# Altium schematic symbol library jlcpcb_2025_04_capacitors_extended_0201.schlib: 1175 symbols (part 3 of 7) (continued)
## CQ0201ARNPO8BNR20
designator C?  Capacitance: 0.2pF  (hidden comment: *)
Capacitor, Ceramic (MLCC), 0.2pF, 25V, NP0, SMD 0201; Manufacturer: YAGEO; Manufacturer Part Number: CQ0201ARNPO8BNR20; Package Size: 0201; JLCPCB Basic Part: No; JLCPCB Part Number: C914770; Supplier 1: LCSC; Category: Capacitors - MLCC; Supplier Part Number 1: C914770; Voltage Rating: 25V; Temperature Coefficient: NP0; RoHS: Yes; ComponentLink1Description: Datasheet; ComponentLink1URL: https://wmsc.lcsc.com/wmsc/upload/file/pdf/v2/lcsc/2204291430_YAGEO-CQ0201ARNPO8BNR20_C914770.pdf; ComponentLink2Description: JLCPCB Part URL; ComponentLink2URL: https://jlcpcb.com/partdetail/C914770; ComponentLink3Description: LCSC Part URL; ComponentLink3URL: https://lcsc.com/product-detail/Multilayer-Ceramic-Capacitors-MLCC---SMD-SMT_YAGEO-YAGEO-CQ0201ARNPO8BNR20_C914770.html
footprint CAP-0201 (0201 (0603M) Capacitor)
pins: 1, 2

## CQ0201ARNPO8BNR30
designator C?  Capacitance: 0.3pF  (hidden comment: *)
Capacitor, Ceramic (MLCC), 0.3pF, 25V, NP0, SMD 0201; Manufacturer: YAGEO; Manufacturer Part Number: CQ0201ARNPO8BNR30; Package Size: 0201; JLCPCB Basic Part: No; JLCPCB Part Number: C2188760; Supplier 1: LCSC; Category: Capacitors - MLCC; Supplier Part Number 1: C2188760; Voltage Rating: 25V; Temperature Coefficient: NP0; RoHS: Yes; ComponentLink1Description: Datasheet; ComponentLink1URL: https://wmsc.lcsc.com/wmsc/upload/file/pdf/v2/lcsc/2202041800_YAGEO-CQ0201ARNPO8BNR30_C2188760.pdf; ComponentLink2Description: JLCPCB Part URL; ComponentLink2URL: https://jlcpcb.com/partdetail/C2188760; ComponentLink3Description: LCSC Part URL; ComponentLink3URL: https://lcsc.com/product-detail/Multilayer-Ceramic-Capacitors-MLCC---SMD-SMT_YAGEO-YAGEO-CQ0201ARNPO8BNR30_C2188760.html
footprint CAP-0201 (0201 (0603M) Capacitor)
pins: 1, 2

## CQ0201ARNPO8BNR40
designator C?  Capacitance: 0.4pF  (hidden comment: *)
Capacitor, Ceramic (MLCC), 0.4pF, 25V, SMD 0201; Manufacturer: YAGEO; Manufacturer Part Number: CQ0201ARNPO8BNR40; Package Size: 0201; JLCPCB Basic Part: No; JLCPCB Part Number: C2188764; Supplier 1: LCSC; Category: Capacitors - MLCC; Supplier Part Number 1: C2188764; Voltage Rating: 25V; RoHS: Yes; ComponentLink1Description: Datasheet; ComponentLink1URL: https://wmsc.lcsc.com/wmsc/upload/file/pdf/v2/lcsc/2202041800_YAGEO-CQ0201ARNPO8BNR40_C2188764.pdf; ComponentLink2Description: JLCPCB Part URL; ComponentLink2URL: https://jlcpcb.com/partdetail/C2188764; ComponentLink3Description: LCSC Part URL; ComponentLink3URL: https://lcsc.com/product-detail/Multilayer-Ceramic-Capacitors-MLCC---SMD-SMT_YAGEO-YAGEO-CQ0201ARNPO8BNR40_C2188764.html
footprint CAP-0201 (0201 (0603M) Capacitor)
pins: 1, 2

## CQ0201ARNPO8BNR50
designator C?  Capacitance: 0.5pF  (hidden comment: *)
Capacitor, Ceramic (MLCC), 0.5pF, 25V, NP0, SMD 0201; Manufacturer: YAGEO; Manufacturer Part Number: CQ0201ARNPO8BNR50; Package Size: 0201; JLCPCB Basic Part: No; JLCPCB Part Number: C2196095; Supplier 1: LCSC; Category: Capacitors - MLCC; Supplier Part Number 1: C2196095; Voltage Rating: 25V; Temperature Coefficient: NP0; RoHS: Yes; ComponentLink1Description: Datasheet; ComponentLink1URL: https://wmsc.lcsc.com/wmsc/upload/file/pdf/v2/lcsc/2304140030_YAGEO-CQ0201ARNPO8BNR50_C2196095.pdf; ComponentLink2Description: JLCPCB Part URL; ComponentLink2URL: https://jlcpcb.com/partdetail/C2196095; ComponentLink3Description: LCSC Part URL; ComponentLink3URL: https://lcsc.com/product-detail/Multilayer-Ceramic-Capacitors-MLCC---SMD-SMT_YAGEO-YAGEO-CQ0201ARNPO8BNR50_C2196095.html
footprint CAP-0201 (0201 (0603M) Capacitor)
pins: 1, 2

## CQ0201ARNPO8BNR90
designator C?  Capacitance: 0.9pF  (hidden comment: *)
Capacitor, Ceramic (MLCC), 0.9pF, 25V, NP0, SMD 0201; Manufacturer: YAGEO; Manufacturer Part Number: CQ0201ARNPO8BNR90; Package Size: 0201; JLCPCB Basic Part: No; JLCPCB Part Number: C914771; Supplier 1: LCSC; Category: Capacitors - MLCC; Supplier Part Number 1: C914771; Voltage Rating: 25V; Temperature Coefficient: NP0; RoHS: Yes; ComponentLink1Description: Datasheet; ComponentLink1URL: https://wmsc.lcsc.com/wmsc/upload/file/pdf/v2/lcsc/2211141030_YAGEO-CQ0201ARNPO8BNR90_C914771.pdf; ComponentLink2Description: JLCPCB Part URL; ComponentLink2URL: https://jlcpcb.com/partdetail/C914771; ComponentLink3Description: LCSC Part URL; ComponentLink3URL: https://lcsc.com/product-detail/Multilayer-Ceramic-Capacitors-MLCC---SMD-SMT_YAGEO-YAGEO-CQ0201ARNPO8BNR90_C914771.html
footprint CAP-0201 (0201 (0603M) Capacitor)
pins: 1, 2

## CQ0201ARNPO9BN1R0
designator C?  Capacitance: 1pF  (hidden comment: *)
Capacitor, Ceramic (MLCC), 1pF, 50V, NP0, SMD 0201; Manufacturer: YAGEO; Manufacturer Part Number: CQ0201ARNPO9BN1R0; Package Size: 0201; JLCPCB Basic Part: No; JLCPCB Part Number: C3001928; Supplier 1: LCSC; Category: Capacitors - MLCC; Supplier Part Number 1: C3001928; Voltage Rating: 50V; Temperature Coefficient: NP0; RoHS: Yes; ComponentLink1Description: Datasheet; ComponentLink1URL: https://wmsc.lcsc.com/wmsc/upload/file/pdf/v2/lcsc/2204251600_YAGEO-CQ0201ARNPO9BN1R0_C3001928.pdf; ComponentLink2Description: JLCPCB Part URL; ComponentLink2URL: https://jlcpcb.com/partdetail/C3001928; ComponentLink3Description: LCSC Part URL; ComponentLink3URL: https://lcsc.com/product-detail/Multilayer-Ceramic-Capacitors-MLCC---SMD-SMT_YAGEO-YAGEO-CQ0201ARNPO9BN1R0_C3001928.html
footprint CAP-0201 (0201 (0603M) Capacitor)
pins: 1, 2

## CQ0201ARNPO9BNR30
designator C?  Capacitance: 0.3pF  (hidden comment: *)
Capacitor, Ceramic (MLCC), 0.3pF, 50V, NP0, SMD 0201; Manufacturer: YAGEO; Manufacturer Part Number: CQ0201ARNPO9BNR30; Package Size: 0201; JLCPCB Basic Part: No; JLCPCB Part Number: C1855100; Supplier 1: LCSC; Category: Capacitors - MLCC; Supplier Part Number 1: C1855100; Voltage Rating: 50V; Temperature Coefficient: NP0; RoHS: Yes; ComponentLink1Description: Datasheet; ComponentLink1URL: https://wmsc.lcsc.com/wmsc/upload/file/pdf/v2/lcsc/2201041830_YAGEO-CQ0201ARNPO9BNR30_C1855100.pdf; ComponentLink2Description: JLCPCB Part URL; ComponentLink2URL: https://jlcpcb.com/partdetail/C1855100; ComponentLink3Description: LCSC Part URL; ComponentLink3URL: https://lcsc.com/product-detail/Multilayer-Ceramic-Capacitors-MLCC---SMD-SMT_YAGEO-YAGEO-CQ0201ARNPO9BNR30_C1855100.html
footprint CAP-0201 (0201 (0603M) Capacitor)
pins: 1, 2

## CQ0201BRNPO8BN1R5
designator C?  Capacitance: 1.5pF  (hidden comment: *)
Capacitor, Ceramic (MLCC), 1.5pF, 25V, NP0, SMD 0201; Manufacturer: YAGEO; Manufacturer Part Number: CQ0201BRNPO8BN1R5; Package Size: 0201; JLCPCB Basic Part: No; JLCPCB Part Number: C577357; Supplier 1: LCSC; Category: Capacitors - MLCC; Supplier Part Number 1: C577357; Voltage Rating: 25V; Temperature Coefficient: NP0; RoHS: Yes; ComponentLink1Description: Datasheet; ComponentLink1URL: https://wmsc.lcsc.com/wmsc/upload/file/pdf/v2/lcsc/2206221715_YAGEO-CQ0201BRNPO8BN1R5_C577357.pdf; ComponentLink2Description: JLCPCB Part URL; ComponentLink2URL: https://jlcpcb.com/partdetail/C577357; ComponentLink3Description: LCSC Part URL; ComponentLink3URL: https://lcsc.com/product-detail/Multilayer-Ceramic-Capacitors-MLCC---SMD-SMT_YAGEO-YAGEO-CQ0201BRNPO8BN1R5_C577357.html
footprint CAP-0201 (0201 (0603M) Capacitor)
pins: 1, 2

## CQ0201BRNPO8BN2R0
designator C?  Capacitance: 2pF  (hidden comment: *)
Capacitor, Ceramic (MLCC), 2pF, 25V, NP0, SMD 0201; Manufacturer: YAGEO; Manufacturer Part Number: CQ0201BRNPO8BN2R0; Package Size: 0201; JLCPCB Basic Part: No; JLCPCB Part Number: C577359; Supplier 1: LCSC; Category: Capacitors - MLCC; Supplier Part Number 1: C577359; Voltage Rating: 25V; Temperature Coefficient: NP0; RoHS: Yes; ComponentLink1Description: Datasheet; ComponentLink1URL: https://wmsc.lcsc.com/wmsc/upload/file/pdf/v2/lcsc/2206221715_YAGEO-CQ0201BRNPO8BN2R0_C577359.pdf; ComponentLink2Description: JLCPCB Part URL; ComponentLink2URL: https://jlcpcb.com/partdetail/C577359; ComponentLink3Description: LCSC Part URL; ComponentLink3URL: https://lcsc.com/product-detail/Multilayer-Ceramic-Capacitors-MLCC---SMD-SMT_YAGEO-YAGEO-CQ0201BRNPO8BN2R0_C577359.html
footprint CAP-0201 (0201 (0603M) Capacitor)
pins: 1, 2

## CQ0201BRNPO8BN2R4
designator C?  Capacitance: 2.4pF  (hidden comment: *)
Capacitor, Ceramic (MLCC), 2.4pF, 25V, NP0, SMD 0201; Manufacturer: YAGEO; Manufacturer Part Number: CQ0201BRNPO8BN2R4; Package Size: 0201; JLCPCB Basic Part: No; JLCPCB Part Number: C2208911; Supplier 1: LCSC; Category: Capacitors - MLCC; Supplier Part Number 1: C2208911; Voltage Rating: 25V; Temperature Coefficient: NP0; RoHS: Yes; ComponentLink1Description: Datasheet; ComponentLink1URL: https://wmsc.lcsc.com/wmsc/upload/file/pdf/v2/lcsc/2304140030_YAGEO-CQ0201BRNPO8BN2R4_C2208911.pdf; ComponentLink2Description: JLCPCB Part URL; ComponentLink2URL: https://jlcpcb.com/partdetail/C2208911; ComponentLink3Description: LCSC Part URL; ComponentLink3URL: https://lcsc.com/product-detail/Multilayer-Ceramic-Capacitors-MLCC---SMD-SMT_YAGEO-YAGEO-CQ0201BRNPO8BN2R4_C2208911.html
footprint CAP-0201 (0201 (0603M) Capacitor)
pins: 1, 2

## CQ0201BRNPO8BN3R3
designator C?  Capacitance: 3.3pF  (hidden comment: *)
Capacitor, Ceramic (MLCC), 3.3pF, 25V, NP0, SMD 0201; Manufacturer: YAGEO; Manufacturer Part Number: CQ0201BRNPO8BN3R3; Package Size: 0201; JLCPCB Basic Part: No; JLCPCB Part Number: C2208907; Supplier 1: LCSC; Category: Capacitors - MLCC; Supplier Part Number 1: C2208907; Voltage Rating: 25V; Temperature Coefficient: NP0; RoHS: Yes; ComponentLink1Description: Datasheet; ComponentLink1URL: https://wmsc.lcsc.com/wmsc/upload/file/pdf/v2/lcsc/2304140030_YAGEO-CQ0201BRNPO8BN3R3_C2208907.pdf; ComponentLink2Description: JLCPCB Part URL; ComponentLink2URL: https://jlcpcb.com/partdetail/C2208907; ComponentLink3Description: LCSC Part URL; ComponentLink3URL: https://lcsc.com/product-detail/Multilayer-Ceramic-Capacitors-MLCC---SMD-SMT_YAGEO-YAGEO-CQ0201BRNPO8BN3R3_C2208907.html
footprint CAP-0201 (0201 (0603M) Capacitor)
pins: 1, 2

## CQ0201BRNPO8BN3R9
designator C?  Capacitance: 3.9pF  (hidden comment: *)
Capacitor, Ceramic (MLCC), 3.9pF, 25V, NP0, SMD 0201; Manufacturer: YAGEO; Manufacturer Part Number: CQ0201BRNPO8BN3R9; Package Size: 0201; JLCPCB Basic Part: No; JLCPCB Part Number: C577362; Supplier 1: LCSC; Category: Capacitors - MLCC; Supplier Part Number 1: C577362; Voltage Rating: 25V; Temperature Coefficient: NP0; RoHS: Yes; ComponentLink1Description: Datasheet; ComponentLink1URL: https://wmsc.lcsc.com/wmsc/upload/file/pdf/v2/lcsc/2203221230_YAGEO-CQ0201BRNPO8BN3R9_C577362.pdf; ComponentLink2Description: JLCPCB Part URL; ComponentLink2URL: https://jlcpcb.com/partdetail/C577362; ComponentLink3Description: LCSC Part URL; ComponentLink3URL: https://lcsc.com/product-detail/Multilayer-Ceramic-Capacitors-MLCC---SMD-SMT_YAGEO-YAGEO-CQ0201BRNPO8BN3R9_C577362.html
footprint CAP-0201 (0201 (0603M) Capacitor)
pins: 1, 2

## CQ0201BRNPO8BN4R0
designator C?  Capacitance: 4pF  (hidden comment: *)
Capacitor, Ceramic (MLCC), 4pF, 25V, SMD 0201; Manufacturer: YAGEO; Manufacturer Part Number: CQ0201BRNPO8BN4R0; Package Size: 0201; JLCPCB Basic Part: No; JLCPCB Part Number: C2209025; Supplier 1: LCSC; Category: Capacitors - MLCC; Supplier Part Number 1: C2209025; Voltage Rating: 25V; RoHS: Yes; ComponentLink1Description: Datasheet; ComponentLink1URL: https://wmsc.lcsc.com/wmsc/upload/file/pdf/v2/lcsc/2304140030_YAGEO-CQ0201BRNPO8BN4R0_C2209025.pdf; ComponentLink2Description: JLCPCB Part URL; ComponentLink2URL: https://jlcpcb.com/partdetail/C2209025; ComponentLink3Description: LCSC Part URL; ComponentLink3URL: https://lcsc.com/product-detail/Multilayer-Ceramic-Capacitors-MLCC---SMD-SMT_YAGEO-YAGEO-CQ0201BRNPO8BN4R0_C2209025.html
footprint CAP-0201 (0201 (0603M) Capacitor)
pins: 1, 2

## CQ0201BRNPO8BN8R2
designator C?  Capacitance: 8.2pF  (hidden comment: *)
Capacitor, Ceramic (MLCC), 8.2pF, 25V, NP0, SMD 0201; Manufacturer: YAGEO; Manufacturer Part Number: CQ0201BRNPO8BN8R2; Package Size: 0201; JLCPCB Basic Part: No; JLCPCB Part Number: C1855316; Supplier 1: LCSC; Category: Capacitors - MLCC; Supplier Part Number 1: C1855316; Voltage Rating: 25V; Temperature Coefficient: NP0; RoHS: Yes; ComponentLink1Description: Datasheet; ComponentLink1URL: https://wmsc.lcsc.com/wmsc/upload/file/pdf/v2/lcsc/2201271230_YAGEO-CQ0201BRNPO8BN8R2_C1855316.pdf; ComponentLink2Description: JLCPCB Part URL; ComponentLink2URL: https://jlcpcb.com/partdetail/C1855316; ComponentLink3Description: LCSC Part URL; ComponentLink3URL: https://lcsc.com/product-detail/Multilayer-Ceramic-Capacitors-MLCC---SMD-SMT_YAGEO-YAGEO-CQ0201BRNPO8BN8R2_C1855316.html
footprint CAP-0201 (0201 (0603M) Capacitor)
pins: 1, 2

## CQ0201BRNPO8BNR80
designator C?  Capacitance: 0.8pF  (hidden comment: *)
Capacitor, Ceramic (MLCC), 0.8pF, 25V, NP0, SMD 0201; Manufacturer: YAGEO; Manufacturer Part Number: CQ0201BRNPO8BNR80; Package Size: 0201; JLCPCB Basic Part: No; JLCPCB Part Number: C2185665; Supplier 1: LCSC; Category: Capacitors - MLCC; Supplier Part Number 1: C2185665; Voltage Rating: 25V; Temperature Coefficient: NP0; RoHS: Yes; ComponentLink1Description: Datasheet; ComponentLink1URL: https://wmsc.lcsc.com/wmsc/upload/file/pdf/v2/lcsc/2202041530_YAGEO-CQ0201BRNPO8BNR80_C2185665.pdf; ComponentLink2Description: JLCPCB Part URL; ComponentLink2URL: https://jlcpcb.com/partdetail/C2185665; ComponentLink3Description: LCSC Part URL; ComponentLink3URL: https://lcsc.com/product-detail/Multilayer-Ceramic-Capacitors-MLCC---SMD-SMT_YAGEO-YAGEO-CQ0201BRNPO8BNR80_C2185665.html
footprint CAP-0201 (0201 (0603M) Capacitor)
pins: 1, 2

## CQ0201BRNPO9BN1R4
designator C?  Capacitance: 1.4pF  (hidden comment: *)
Capacitor, Ceramic (MLCC), 1.4pF, 50V, NP0, SMD 0201; Manufacturer: YAGEO; Manufacturer Part Number: CQ0201BRNPO9BN1R4; Package Size: 0201; JLCPCB Basic Part: No; JLCPCB Part Number: C2936592; Supplier 1: LCSC; Category: Capacitors - MLCC; Supplier Part Number 1: C2936592; Voltage Rating: 50V; Temperature Coefficient: NP0; RoHS: Yes; ComponentLink1Description: Datasheet; ComponentLink1URL: https://wmsc.lcsc.com/wmsc/upload/file/pdf/v2/lcsc/2201121730_YAGEO-CQ0201BRNPO9BN1R4_C2936592.pdf; ComponentLink2Description: JLCPCB Part URL; ComponentLink2URL: https://jlcpcb.com/partdetail/C2936592; ComponentLink3Description: LCSC Part URL; ComponentLink3URL: https://lcsc.com/product-detail/Multilayer-Ceramic-Capacitors-MLCC---SMD-SMT_YAGEO-YAGEO-CQ0201BRNPO9BN1R4_C2936592.html
footprint CAP-0201 (0201 (0603M) Capacitor)
pins: 1, 2

## CQ0201BRNPO9BN1R5
designator C?  Capacitance: 1.5pF  (hidden comment: *)
Capacitor, Ceramic (MLCC), 1.5pF, 50V, NP0, SMD 0201; Manufacturer: YAGEO; Manufacturer Part Number: CQ0201BRNPO9BN1R5; Package Size: 0201; JLCPCB Basic Part: No; JLCPCB Part Number: C2897348; Supplier 1: LCSC; Category: Capacitors - MLCC; Supplier Part Number 1: C2897348; Voltage Rating: 50V; Temperature Coefficient: NP0; RoHS: Yes; ComponentLink1Description: Datasheet; ComponentLink1URL: https://wmsc.lcsc.com/wmsc/upload/file/pdf/v2/lcsc/2203081130_YAGEO-CQ0201BRNPO9BN1R5_C2897348.pdf; ComponentLink2Description: JLCPCB Part URL; ComponentLink2URL: https://jlcpcb.com/partdetail/C2897348; ComponentLink3Description: LCSC Part URL; ComponentLink3URL: https://lcsc.com/product-detail/Multilayer-Ceramic-Capacitors-MLCC---SMD-SMT_YAGEO-YAGEO-CQ0201BRNPO9BN1R5_C2897348.html
footprint CAP-0201 (0201 (0603M) Capacitor)
pins: 1, 2

## CQ0201BRNPO9BN1R8
designator C?  Capacitance: 1.8pF  (hidden comment: *)
Capacitor, Ceramic (MLCC), 1.8pF, 50V, NP0, SMD 0201; Manufacturer: YAGEO; Manufacturer Part Number: CQ0201BRNPO9BN1R8; Package Size: 0201; JLCPCB Basic Part: No; JLCPCB Part Number: C1855048; Supplier 1: LCSC; Category: Capacitors - MLCC; Supplier Part Number 1: C1855048; Voltage Rating: 50V; Temperature Coefficient: NP0; RoHS: Yes; ComponentLink1Description: Datasheet; ComponentLink1URL: https://wmsc.lcsc.com/wmsc/upload/file/pdf/v2/lcsc/2203301630_YAGEO-CQ0201BRNPO9BN1R8_C1855048.pdf; ComponentLink2Description: JLCPCB Part URL; ComponentLink2URL: https://jlcpcb.com/partdetail/C1855048; ComponentLink3Description: LCSC Part URL; ComponentLink3URL: https://lcsc.com/product-detail/Multilayer-Ceramic-Capacitors-MLCC---SMD-SMT_YAGEO-YAGEO-CQ0201BRNPO9BN1R8_C1855048.html
footprint CAP-0201 (0201 (0603M) Capacitor)
pins: 1, 2

## CQ0201BRNPO9BN2R2
designator C?  Capacitance: 2.2pF  (hidden comment: *)
Capacitor, Ceramic (MLCC), 2.2pF, 50V, NP0, SMD 0201; Manufacturer: YAGEO; Manufacturer Part Number: CQ0201BRNPO9BN2R2; Package Size: 0201; JLCPCB Basic Part: No; JLCPCB Part Number: C2897349; Supplier 1: LCSC; Category: Capacitors - MLCC; Supplier Part Number 1: C2897349; Voltage Rating: 50V; Temperature Coefficient: NP0; RoHS: Yes; ComponentLink1Description: Datasheet; ComponentLink1URL: https://wmsc.lcsc.com/wmsc/upload/file/pdf/v2/lcsc/2203221230_YAGEO-CQ0201BRNPO9BN2R2_C2897349.pdf; ComponentLink2Description: JLCPCB Part URL; ComponentLink2URL: https://jlcpcb.com/partdetail/C2897349; ComponentLink3Description: LCSC Part URL; ComponentLink3URL: https://lcsc.com/product-detail/Multilayer-Ceramic-Capacitors-MLCC---SMD-SMT_YAGEO-YAGEO-CQ0201BRNPO9BN2R2_C2897349.html
footprint CAP-0201 (0201 (0603M) Capacitor)
pins: 1, 2

## CQ0201BRNPO9BN2R3
designator C?  Capacitance: 2.3pF  (hidden comment: *)
Capacitor, Ceramic (MLCC), 2.3pF, 50V, C0G, SMD 0201; Manufacturer: YAGEO; Manufacturer Part Number: CQ0201BRNPO9BN2R3; Package Size: 0201; JLCPCB Basic Part: No; JLCPCB Part Number: C3892199; Supplier 1: LCSC; Category: Capacitors - MLCC; Supplier Part Number 1: C3892199; Voltage Rating: 50V; Temperature Coefficient: C0G; RoHS: Yes; ComponentLink1Description: Datasheet; ComponentLink1URL: https://wmsc.lcsc.com/wmsc/upload/file/pdf/v2/lcsc/2311211124_YAGEO-CQ0201BRNPO9BN2R3_C3892199.pdf; ComponentLink2Description: JLCPCB Part URL; ComponentLink2URL: https://jlcpcb.com/partdetail/C3892199; ComponentLink3Description: LCSC Part URL; ComponentLink3URL: https://lcsc.com/product-detail/Multilayer-Ceramic-Capacitors-MLCC---SMD-SMT_YAGEO-YAGEO-CQ0201BRNPO9BN2R3_C3892199.html
footprint CAP-0201 (0201 (0603M) Capacitor)
pins: 1, 2

## CQ0201BRNPO9BN2R7
designator C?  Capacitance: 2.7pF  (hidden comment: *)
Capacitor, Ceramic (MLCC), 2.7pF, 50V, NP0, SMD 0201; Manufacturer: YAGEO; Manufacturer Part Number: CQ0201BRNPO9BN2R7; Package Size: 0201; JLCPCB Basic Part: No; JLCPCB Part Number: C2897350; Supplier 1: LCSC; Category: Capacitors - MLCC; Supplier Part Number 1: C2897350; Voltage Rating: 50V; Temperature Coefficient: NP0; RoHS: Yes; ComponentLink1Description: Datasheet; ComponentLink1URL: https://wmsc.lcsc.com/wmsc/upload/file/pdf/v2/lcsc/2203221230_YAGEO-CQ0201BRNPO9BN2R7_C2897350.pdf; ComponentLink2Description: JLCPCB Part URL; ComponentLink2URL: https://jlcpcb.com/partdetail/C2897350; ComponentLink3Description: LCSC Part URL; ComponentLink3URL: https://lcsc.com/product-detail/Multilayer-Ceramic-Capacitors-MLCC---SMD-SMT_YAGEO-YAGEO-CQ0201BRNPO9BN2R7_C2897350.html
footprint CAP-0201 (0201 (0603M) Capacitor)
pins: 1, 2

## CQ0201BRNPO9BN3R0
designator C?  Capacitance: 3pF  (hidden comment: *)
Capacitor, Ceramic (MLCC), 3pF, 50V, NP0, SMD 0201; Manufacturer: YAGEO; Manufacturer Part Number: CQ0201BRNPO9BN3R0; Package Size: 0201; JLCPCB Basic Part: No; JLCPCB Part Number: C2897351; Supplier 1: LCSC; Category: Capacitors - MLCC; Supplier Part Number 1: C2897351; Voltage Rating: 50V; Temperature Coefficient: NP0; RoHS: Yes; ComponentLink1Description: Datasheet; ComponentLink1URL: https://wmsc.lcsc.com/wmsc/upload/file/pdf/v2/lcsc/2203301630_YAGEO-CQ0201BRNPO9BN3R0_C2897351.pdf; ComponentLink2Description: JLCPCB Part URL; ComponentLink2URL: https://jlcpcb.com/partdetail/C2897351; ComponentLink3Description: LCSC Part URL; ComponentLink3URL: https://lcsc.com/product-detail/Multilayer-Ceramic-Capacitors-MLCC---SMD-SMT_YAGEO-YAGEO-CQ0201BRNPO9BN3R0_C2897351.html
footprint CAP-0201 (0201 (0603M) Capacitor)
pins: 1, 2

## CQ0201BRNPO9BNR20
designator C?  Capacitance: 0.2pF  (hidden comment: *)
Capacitor, Ceramic (MLCC), 0.2pF, 50V, NP0, SMD 0201; Manufacturer: YAGEO; Manufacturer Part Number: CQ0201BRNPO9BNR20; Package Size: 0201; JLCPCB Basic Part: No; JLCPCB Part Number: C1855036; Supplier 1: LCSC; Category: Capacitors - MLCC; Supplier Part Number 1: C1855036; Voltage Rating: 50V; Temperature Coefficient: NP0; RoHS: Yes; ComponentLink1Description: Datasheet; ComponentLink1URL: https://wmsc.lcsc.com/wmsc/upload/file/pdf/v2/lcsc/2112151830_YAGEO-CQ0201BRNPO9BNR20_C1855036.pdf; ComponentLink2Description: JLCPCB Part URL; ComponentLink2URL: https://jlcpcb.com/partdetail/C1855036; ComponentLink3Description: LCSC Part URL; ComponentLink3URL: https://lcsc.com/product-detail/Multilayer-Ceramic-Capacitors-MLCC---SMD-SMT_YAGEO-YAGEO-CQ0201BRNPO9BNR20_C1855036.html
footprint CAP-0201 (0201 (0603M) Capacitor)
pins: 1, 2

## CQ0201CRNPO8BN1R2
designator C?  Capacitance: 1.2pF  (hidden comment: *)
Capacitor, Ceramic (MLCC), 1.2pF, 25V, NP0, SMD 0201; Manufacturer: YAGEO; Manufacturer Part Number: CQ0201CRNPO8BN1R2; Package Size: 0201; JLCPCB Basic Part: No; JLCPCB Part Number: C1855072; Supplier 1: LCSC; Category: Capacitors - MLCC; Supplier Part Number 1: C1855072; Voltage Rating: 25V; Temperature Coefficient: NP0; RoHS: Yes; ComponentLink1Description: Datasheet; ComponentLink1URL: https://wmsc.lcsc.com/wmsc/upload/file/pdf/v2/lcsc/2201271230_YAGEO-CQ0201CRNPO8BN1R2_C1855072.pdf; ComponentLink2Description: JLCPCB Part URL; ComponentLink2URL: https://jlcpcb.com/partdetail/C1855072; ComponentLink3Description: LCSC Part URL; ComponentLink3URL: https://lcsc.com/product-detail/Multilayer-Ceramic-Capacitors-MLCC---SMD-SMT_YAGEO-YAGEO-CQ0201CRNPO8BN1R2_C1855072.html
footprint CAP-0201 (0201 (0603M) Capacitor)
pins: 1, 2

## CQ0201CRNPO8BN6R0
designator C?  Capacitance: 6pF  (hidden comment: *)
Capacitor, Ceramic (MLCC), 6pF, 25V, NP0, SMD 0201; Manufacturer: YAGEO; Manufacturer Part Number: CQ0201CRNPO8BN6R0; Package Size: 0201; JLCPCB Basic Part: No; JLCPCB Part Number: C2194547; Supplier 1: LCSC; Category: Capacitors - MLCC; Supplier Part Number 1: C2194547; Voltage Rating: 25V; Temperature Coefficient: NP0; RoHS: Yes; ComponentLink1Description: Datasheet; ComponentLink1URL: https://wmsc.lcsc.com/wmsc/upload/file/pdf/v2/lcsc/2304140030_YAGEO-CQ0201CRNPO8BN6R0_C2194547.pdf; ComponentLink2Description: JLCPCB Part URL; ComponentLink2URL: https://jlcpcb.com/partdetail/C2194547; ComponentLink3Description: LCSC Part URL; ComponentLink3URL: https://lcsc.com/product-detail/Multilayer-Ceramic-Capacitors-MLCC---SMD-SMT_YAGEO-YAGEO-CQ0201CRNPO8BN6R0_C2194547.html
footprint CAP-0201 (0201 (0603M) Capacitor)
pins: 1, 2

## CQ0201JRNPO8BN100
designator C?  Capacitance: 10pF  (hidden comment: *)
Capacitor, Ceramic (MLCC), 10pF, ±5%, 25V, NP0, ±5%, SMD 0201; Manufacturer: YAGEO; Manufacturer Part Number: CQ0201JRNPO8BN100; Package Size: 0201; JLCPCB Basic Part: No; JLCPCB Part Number: C577369; Supplier 1: LCSC; Category: Capacitors - MLCC; Supplier Part Number 1: C577369; Tolerance: ±5%; Voltage Rating: 25V; Temperature Coefficient: NP0; RoHS: Yes; ComponentLink1Description: Datasheet; ComponentLink1URL: https://wmsc.lcsc.com/wmsc/upload/file/pdf/v2/lcsc/2204251545_YAGEO-CQ0201JRNPO8BN100_C577369.pdf; ComponentLink2Description: JLCPCB Part URL; ComponentLink2URL: https://jlcpcb.com/partdetail/C577369; ComponentLink3Description: LCSC Part URL; ComponentLink3URL: https://lcsc.com/product-detail/Multilayer-Ceramic-Capacitors-MLCC---SMD-SMT_YAGEO-YAGEO-CQ0201JRNPO8BN100_C577369.html
footprint CAP-0201 (0201 (0603M) Capacitor)
pins: 1, 2

## CSA0201X5R104K6R3ET
designator C?  Capacitance: 100nF  (hidden comment: *)
Capacitor, Ceramic (MLCC), 100nF, ±10%, 6.3V, X5R, ±10%, SMD 0201; Manufacturer: HRE; Manufacturer Part Number: CSA0201X5R104K6R3ET; Package Size: 0201; JLCPCB Basic Part: No; JLCPCB Part Number: C3012372; Supplier 1: LCSC; Category: Capacitors - MLCC; Supplier Part Number 1: C3012372; Tolerance: ±10%; Voltage Rating: 6.3V; Temperature Coefficient: X5R; RoHS: Yes; ComponentLink1Description: Datasheet; ComponentLink1URL: https://wmsc.lcsc.com/wmsc/upload/file/pdf/v2/lcsc/2206081716_HRE-CSA0201X5R104K6R3ET_C3012372.pdf; ComponentLink2Description: JLCPCB Part URL; ComponentLink2URL: https://jlcpcb.com/partdetail/C3012372; ComponentLink3Description: LCSC Part URL; ComponentLink3URL: https://lcsc.com/product-detail/Multilayer-Ceramic-Capacitors-MLCC---SMD-SMT_HRE-HRE-CSA0201X5R104K6R3ET_C3012372.html
footprint CAP-0201 (0201 (0603M) Capacitor)
pins: 1, 2

## CSA0201X7R102K250ET
designator C?  Capacitance: 1nF  (hidden comment: *)
Capacitor, Ceramic (MLCC), 1nF, ±10%, 25V, X7R, ±10%, SMD 0201; Manufacturer: HRE; Manufacturer Part Number: CSA0201X7R102K250ET; Package Size: 0201; JLCPCB Basic Part: No; JLCPCB Part Number: C3015112; Supplier 1: LCSC; Category: Capacitors - MLCC; Supplier Part Number 1: C3015112; Tolerance: ±10%; Voltage Rating: 25V; Temperature Coefficient: X7R; RoHS: Yes; ComponentLink1Description: Datasheet; ComponentLink1URL: https://wmsc.lcsc.com/wmsc/upload/file/pdf/v2/lcsc/2208051100_HRE-CSA0201X7R102K250ET_C3015112.pdf; ComponentLink2Description: JLCPCB Part URL; ComponentLink2URL: https://jlcpcb.com/partdetail/C3015112; ComponentLink3Description: LCSC Part URL; ComponentLink3URL: https://lcsc.com/product-detail/Multilayer-Ceramic-Capacitors-MLCC---SMD-SMT_HRE-HRE-CSA0201X7R102K250ET_C3015112.html
footprint CAP-0201 (0201 (0603M) Capacitor)
pins: 1, 2

## CSA0201X7R102K500ET
designator C?  Capacitance: 1nF  (hidden comment: *)
Capacitor, Ceramic (MLCC), 1nF, ±10%, 50V, X7R, ±10%, SMD 0201; Manufacturer: HRE; Manufacturer Part Number: CSA0201X7R102K500ET; Package Size: 0201; JLCPCB Basic Part: No; JLCPCB Part Number: C3012370; Supplier 1: LCSC; Category: Capacitors - MLCC; Supplier Part Number 1: C3012370; Tolerance: ±10%; Voltage Rating: 50V; Temperature Coefficient: X7R; RoHS: Yes; ComponentLink1Description: Datasheet; ComponentLink1URL: https://wmsc.lcsc.com/wmsc/upload/file/pdf/v2/lcsc/2206071716_HRE-CSA0201X7R102K500ET_C3012370.pdf; ComponentLink2Description: JLCPCB Part URL; ComponentLink2URL: https://jlcpcb.com/partdetail/C3012370; ComponentLink3Description: LCSC Part URL; ComponentLink3URL: https://lcsc.com/product-detail/Multilayer-Ceramic-Capacitors-MLCC---SMD-SMT_HRE-HRE-CSA0201X7R102K500ET_C3012370.html
footprint CAP-0201 (0201 (0603M) Capacitor)
pins: 1, 2

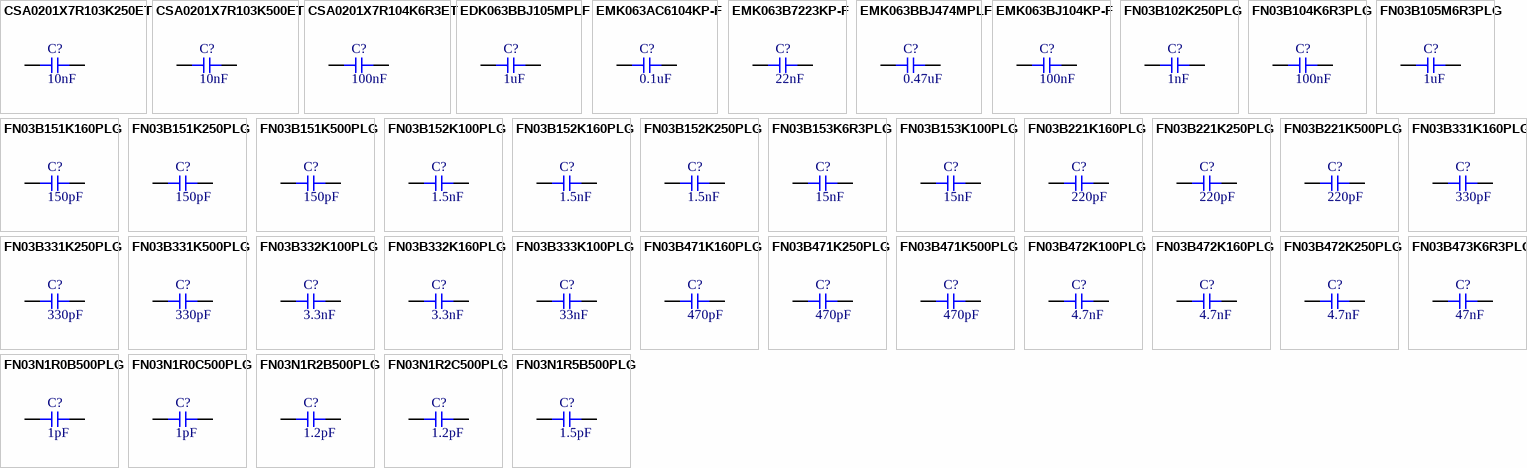
[diagram p11: symbols CSA0201X7R103K250ET to FN03N1R5B500PLG]

## CSA0201X7R103K250ET
designator C?  Capacitance: 10nF  (hidden comment: *)
Capacitor, Ceramic (MLCC), 10nF, ±10%, 25V, X7R, ±10%, SMD 0201; Manufacturer: HRE; Manufacturer Part Number: CSA0201X7R103K250ET; Package Size: 0201; JLCPCB Basic Part: No; JLCPCB Part Number: C3015113; Supplier 1: LCSC; Category: Capacitors - MLCC; Supplier Part Number 1: C3015113; Tolerance: ±10%; Voltage Rating: 25V; Temperature Coefficient: X7R; RoHS: Yes; ComponentLink1Description: Datasheet; ComponentLink1URL: https://wmsc.lcsc.com/wmsc/upload/file/pdf/v2/lcsc/2208051100_HRE-CSA0201X7R103K250ET_C3015113.pdf; ComponentLink2Description: JLCPCB Part URL; ComponentLink2URL: https://jlcpcb.com/partdetail/C3015113; ComponentLink3Description: LCSC Part URL; ComponentLink3URL: https://lcsc.com/product-detail/Multilayer-Ceramic-Capacitors-MLCC---SMD-SMT_HRE-HRE-CSA0201X7R103K250ET_C3015113.html
footprint CAP-0201 (0201 (0603M) Capacitor)
pins: 1, 2

## CSA0201X7R103K500ET
designator C?  Capacitance: 10nF  (hidden comment: *)
Capacitor, Ceramic (MLCC), 10nF, ±10%, 50V, X7R, ±10%, SMD 0201; Manufacturer: HRE; Manufacturer Part Number: CSA0201X7R103K500ET; Package Size: 0201; JLCPCB Basic Part: No; JLCPCB Part Number: C3012371; Supplier 1: LCSC; Category: Capacitors - MLCC; Supplier Part Number 1: C3012371; Tolerance: ±10%; Voltage Rating: 50V; Temperature Coefficient: X7R; RoHS: Yes; ComponentLink1Description: Datasheet; ComponentLink1URL: https://wmsc.lcsc.com/wmsc/upload/file/pdf/v2/lcsc/2208051100_HRE-CSA0201X7R103K500ET_C3012371.pdf; ComponentLink2Description: JLCPCB Part URL; ComponentLink2URL: https://jlcpcb.com/partdetail/C3012371; ComponentLink3Description: LCSC Part URL; ComponentLink3URL: https://lcsc.com/product-detail/Multilayer-Ceramic-Capacitors-MLCC---SMD-SMT_HRE-HRE-CSA0201X7R103K500ET_C3012371.html
footprint CAP-0201 (0201 (0603M) Capacitor)
pins: 1, 2

## CSA0201X7R104K6R3ET
designator C?  Capacitance: 100nF  (hidden comment: *)
Capacitor, Ceramic (MLCC), 100nF, 6.3V, X7R, SMD 0201; Manufacturer: HRE; Manufacturer Part Number: CSA0201X7R104K6R3ET; Package Size: 0201; JLCPCB Basic Part: No; JLCPCB Part Number: C3015114; Supplier 1: LCSC; Category: Capacitors - MLCC; Supplier Part Number 1: C3015114; Voltage Rating: 6.3V; Temperature Coefficient: X7R; RoHS: Yes; ComponentLink1Description: Datasheet; ComponentLink1URL: https://wmsc.lcsc.com/wmsc/upload/file/pdf/v2/lcsc/2208051100_HRE-CSA0201X7R104K6R3ET_C3015114.pdf; ComponentLink2Description: JLCPCB Part URL; ComponentLink2URL: https://jlcpcb.com/partdetail/C3015114; ComponentLink3Description: LCSC Part URL; ComponentLink3URL: https://lcsc.com/product-detail/Multilayer-Ceramic-Capacitors-MLCC---SMD-SMT_HRE-HRE-CSA0201X7R104K6R3ET_C3015114.html
footprint CAP-0201 (0201 (0603M) Capacitor)
pins: 1, 2

## EDK063BBJ105MPLF
designator C?  Capacitance: 1uF  (hidden comment: *)
Capacitor, Ceramic (MLCC), 1uF, ±20%, 16V, X5R, ±20%, SMD 0201; Manufacturer: Taiyo Yuden; Manufacturer Part Number: EDK063BBJ105MPLF; Package Size: 0201; JLCPCB Basic Part: No; JLCPCB Part Number: C412622; Supplier 1: LCSC; Category: Capacitors - MLCC; Supplier Part Number 1: C412622; Tolerance: ±20%; Voltage Rating: 16V; Temperature Coefficient: X5R; RoHS: Yes; ComponentLink1Description: Datasheet; ComponentLink1URL: https://wmsc.lcsc.com/wmsc/upload/file/pdf/v2/lcsc/2005211532_Taiyo-Yuden-EDK063BBJ105MPLF_C412622.pdf; ComponentLink2Description: JLCPCB Part URL; ComponentLink2URL: https://jlcpcb.com/partdetail/C412622; ComponentLink3Description: LCSC Part URL; ComponentLink3URL: https://lcsc.com/product-detail/Multilayer-Ceramic-Capacitors-MLCC---SMD-SMT_Taiyo-Yuden-Taiyo-Yuden-EDK063BBJ105MPLF_C412622.html
footprint CAP-0201 (0201 (0603M) Capacitor)
pins: 1, 2

## EMK063AC6104KP-F
designator C?  Capacitance: 0.1uF  (hidden comment: *)
Capacitor, Ceramic (MLCC), 0.1uF, ±10%, 16V, X6S, ±10%, SMD 0201; Manufacturer: Taiyo Yuden; Manufacturer Part Number: EMK063AC6104KP-F; Package Size: 0201; JLCPCB Basic Part: No; JLCPCB Part Number: C2173858; Supplier 1: LCSC; Category: Capacitors - MLCC; Supplier Part Number 1: C2173858; Tolerance: ±10%; Voltage Rating: 16V; Temperature Coefficient: X6S; RoHS: Yes; ComponentLink1Description: Datasheet; ComponentLink1URL: https://wmsc.lcsc.com/wmsc/upload/file/pdf/v2/lcsc/2211282030_Taiyo-Yuden-EMK063AC6104KP-F_C2173858.pdf; ComponentLink2Description: JLCPCB Part URL; ComponentLink2URL: https://jlcpcb.com/partdetail/C2173858; ComponentLink3Description: LCSC Part URL; ComponentLink3URL: https://lcsc.com/product-detail/Multilayer-Ceramic-Capacitors-MLCC---SMD-SMT_Taiyo-Yuden-Taiyo-Yuden-EMK063AC6104KP-F_C2173858.html
footprint CAP-0201 (0201 (0603M) Capacitor)
pins: 1, 2

## EMK063B7223KP-F
designator C?  Capacitance: 22nF  (hidden comment: *)
Capacitor, Ceramic (MLCC), 22nF, ±10%, 16V, X7R, ±10%, SMD 0201; Manufacturer: Taiyo Yuden; Manufacturer Part Number: EMK063B7223KP-F; Package Size: 0201; JLCPCB Basic Part: No; JLCPCB Part Number: C2880350; Supplier 1: LCSC; Category: Capacitors - MLCC; Supplier Part Number 1: C2880350; Tolerance: ±10%; Voltage Rating: 16V; Temperature Coefficient: X7R; RoHS: Yes; ComponentLink1Description: Datasheet; ComponentLink1URL: https://wmsc.lcsc.com/wmsc/upload/file/pdf/v2/lcsc/2108160930_Taiyo-Yuden-EMK063B7223KP-F_C2880350.pdf; ComponentLink2Description: JLCPCB Part URL; ComponentLink2URL: https://jlcpcb.com/partdetail/C2880350; ComponentLink3Description: LCSC Part URL; ComponentLink3URL: https://lcsc.com/product-detail/Multilayer-Ceramic-Capacitors-MLCC---SMD-SMT_Taiyo-Yuden-Taiyo-Yuden-EMK063B7223KP-F_C2880350.html
footprint CAP-0201 (0201 (0603M) Capacitor)
pins: 1, 2

## EMK063BBJ474MPLF
designator C?  Capacitance: 0.47uF  (hidden comment: *)
Capacitor, Ceramic (MLCC), 0.47uF, ±20%, 16V, X5R, ±20%, SMD 0201; Manufacturer: Taiyo Yuden; Manufacturer Part Number: EMK063BBJ474MPLF; Package Size: 0201; JLCPCB Basic Part: No; JLCPCB Part Number: C2178980; Supplier 1: LCSC; Category: Capacitors - MLCC; Supplier Part Number 1: C2178980; Tolerance: ±20%; Voltage Rating: 16V; Temperature Coefficient: X5R; RoHS: Yes; ComponentLink1Description: Datasheet; ComponentLink1URL: https://wmsc.lcsc.com/wmsc/upload/file/pdf/v2/lcsc/2309051423_Taiyo-Yuden-EMK063BBJ474MPLF_C2178980.pdf; ComponentLink2Description: JLCPCB Part URL; ComponentLink2URL: https://jlcpcb.com/partdetail/C2178980; ComponentLink3Description: LCSC Part URL; ComponentLink3URL: https://lcsc.com/product-detail/Multilayer-Ceramic-Capacitors-MLCC---SMD-SMT_Taiyo-Yuden-Taiyo-Yuden-EMK063BBJ474MPLF_C2178980.html
footprint CAP-0201 (0201 (0603M) Capacitor)
pins: 1, 2

## EMK063BJ104KP-F
designator C?  Capacitance: 100nF  (hidden comment: *)
Capacitor, Ceramic (MLCC), 100nF, ±10%, 16V, X5R, ±10%, SMD 0201; Manufacturer: Taiyo Yuden; Manufacturer Part Number: EMK063BJ104KP-F; Package Size: 0201; JLCPCB Basic Part: No; JLCPCB Part Number: C385886; Supplier 1: LCSC; Category: Capacitors - MLCC; Supplier Part Number 1: C385886; Tolerance: ±10%; Voltage Rating: 16V; Temperature Coefficient: X5R; RoHS: Yes; ComponentLink1Description: Datasheet; ComponentLink1URL: https://wmsc.lcsc.com/wmsc/upload/file/pdf/v2/lcsc/2304140030_Taiyo-Yuden-EMK063BJ104KP-F_C385886.pdf; ComponentLink2Description: JLCPCB Part URL; ComponentLink2URL: https://jlcpcb.com/partdetail/C385886; ComponentLink3Description: LCSC Part URL; ComponentLink3URL: https://lcsc.com/product-detail/Multilayer-Ceramic-Capacitors-MLCC---SMD-SMT_Taiyo-Yuden-Taiyo-Yuden-EMK063BJ104KP-F_C385886.html
footprint CAP-0201 (0201 (0603M) Capacitor)
pins: 1, 2

## FN03B102K250PLG
designator C?  Capacitance: 1nF  (hidden comment: *)
Capacitor, Ceramic (MLCC), 1nF, ±10%, 25V, X5R, ±10%, SMD 0201; Manufacturer: PSA(Prosperity Dielectrics); Manufacturer Part Number: FN03B102K250PLG; Package Size: 0201; JLCPCB Basic Part: No; JLCPCB Part Number: C2875125; Supplier 1: LCSC; Category: Capacitors - MLCC; Supplier Part Number 1: C2875125; Tolerance: ±10%; Voltage Rating: 25V; Temperature Coefficient: X5R; RoHS: Yes; ComponentLink1Description: Datasheet; ComponentLink1URL: https://wmsc.lcsc.com/wmsc/upload/file/pdf/v2/lcsc/2109171130_PSA-Prosperity-Dielectrics-FN03B102K250PLG_C2875125.pdf; ComponentLink2Description: JLCPCB Part URL; ComponentLink2URL: https://jlcpcb.com/partdetail/C2875125; ComponentLink3Description: LCSC Part URL; ComponentLink3URL: https://lcsc.com/product-detail/Multilayer-Ceramic-Capacitors-MLCC---SMD-SMT_PSAProsperity-Dielectrics-PSAProsperity-Dielectrics-FN03B102K250PLG_C2875125.html
footprint CAP-0201 (0201 (0603M) Capacitor)
pins: 1, 2

## FN03B104K6R3PLG
designator C?  Capacitance: 100nF  (hidden comment: *)
Capacitor, Ceramic (MLCC), 100nF, ±10%, 6.3V, ±10%, SMD 0201; Manufacturer: PSA(Prosperity Dielectrics); Manufacturer Part Number: FN03B104K6R3PLG; Package Size: 0201; JLCPCB Basic Part: No; JLCPCB Part Number: C525190; Supplier 1: LCSC; Category: Capacitors - MLCC; Supplier Part Number 1: C525190; Tolerance: ±10%; Voltage Rating: 6.3V; RoHS: Yes; ComponentLink1Description: Datasheet; ComponentLink1URL: https://wmsc.lcsc.com/wmsc/upload/file/pdf/v2/lcsc/2304140030_PSA-Prosperity-Dielectrics-FN03B104K6R3PLG_C525190.pdf; ComponentLink2Description: JLCPCB Part URL; ComponentLink2URL: https://jlcpcb.com/partdetail/C525190; ComponentLink3Description: LCSC Part URL; ComponentLink3URL: https://lcsc.com/product-detail/Multilayer-Ceramic-Capacitors-MLCC---SMD-SMT_PSAProsperity-Dielectrics-PSAProsperity-Dielectrics-FN03B104K6R3PLG_C525190.html
footprint CAP-0201 (0201 (0603M) Capacitor)
pins: 1, 2

## FN03B105M6R3PLG
designator C?  Capacitance: 1uF  (hidden comment: *)
Capacitor, Ceramic (MLCC), 1uF, 6.3V, SMD 0201; Manufacturer: PSA(Prosperity Dielectrics); Manufacturer Part Number: FN03B105M6R3PLG; Package Size: 0201; JLCPCB Basic Part: No; JLCPCB Part Number: C2836870; Supplier 1: LCSC; Category: Capacitors - MLCC; Supplier Part Number 1: C2836870; Voltage Rating: 6.3V; RoHS: Yes; ComponentLink1Description: Datasheet; ComponentLink1URL: https://wmsc.lcsc.com/wmsc/upload/file/pdf/v2/lcsc/2202131930_PSA-Prosperity-Dielectrics-FN03B105M6R3PLG_C2836870.pdf; ComponentLink2Description: JLCPCB Part URL; ComponentLink2URL: https://jlcpcb.com/partdetail/C2836870; ComponentLink3Description: LCSC Part URL; ComponentLink3URL: https://lcsc.com/product-detail/Multilayer-Ceramic-Capacitors-MLCC---SMD-SMT_PSAProsperity-Dielectrics-PSAProsperity-Dielectrics-FN03B105M6R3PLG_C2836870.html
footprint CAP-0201 (0201 (0603M) Capacitor)
pins: 1, 2

## FN03B151K160PLG
designator C?  Capacitance: 150pF  (hidden comment: *)
Capacitor, Ceramic (MLCC), 150pF, ±10%, 16V, ±10%, SMD 0201; Manufacturer: PSA(Prosperity Dielectrics); Manufacturer Part Number: FN03B151K160PLG; Package Size: 0201; JLCPCB Basic Part: No; JLCPCB Part Number: C565500; Supplier 1: LCSC; Category: Capacitors - MLCC; Supplier Part Number 1: C565500; Tolerance: ±10%; Voltage Rating: 16V; RoHS: Yes; ComponentLink1Description: Datasheet; ComponentLink2Description: JLCPCB Part URL; ComponentLink2URL: https://jlcpcb.com/partdetail/C565500; ComponentLink3Description: LCSC Part URL; ComponentLink3URL: https://lcsc.com/product-detail/Multilayer-Ceramic-Capacitors-MLCC---SMD-SMT_PSAProsperity-Dielectrics-PSAProsperity-Dielectrics-FN03B151K160PLG_C565500.html
footprint CAP-0201 (0201 (0603M) Capacitor)
pins: 1, 2

## FN03B151K250PLG
designator C?  Capacitance: 150pF  (hidden comment: *)
Capacitor, Ceramic (MLCC), 150pF, ±10%, 25V, ±10%, SMD 0201; Manufacturer: PSA(Prosperity Dielectrics); Manufacturer Part Number: FN03B151K250PLG; Package Size: 0201; JLCPCB Basic Part: No; JLCPCB Part Number: C565501; Supplier 1: LCSC; Category: Capacitors - MLCC; Supplier Part Number 1: C565501; Tolerance: ±10%; Voltage Rating: 25V; RoHS: Yes; ComponentLink1Description: Datasheet; ComponentLink2Description: JLCPCB Part URL; ComponentLink2URL: https://jlcpcb.com/partdetail/C565501; ComponentLink3Description: LCSC Part URL; ComponentLink3URL: https://lcsc.com/product-detail/Multilayer-Ceramic-Capacitors-MLCC---SMD-SMT_PSAProsperity-Dielectrics-PSAProsperity-Dielectrics-FN03B151K250PLG_C565501.html
footprint CAP-0201 (0201 (0603M) Capacitor)
pins: 1, 2

## FN03B151K500PLG
designator C?  Capacitance: 150pF  (hidden comment: *)
Capacitor, Ceramic (MLCC), 150pF, ±10%, 50V, ±10%, SMD 0201; Manufacturer: PSA(Prosperity Dielectrics); Manufacturer Part Number: FN03B151K500PLG; Package Size: 0201; JLCPCB Basic Part: No; JLCPCB Part Number: C565502; Supplier 1: LCSC; Category: Capacitors - MLCC; Supplier Part Number 1: C565502; Tolerance: ±10%; Voltage Rating: 50V; RoHS: Yes; ComponentLink1Description: Datasheet; ComponentLink2Description: JLCPCB Part URL; ComponentLink2URL: https://jlcpcb.com/partdetail/C565502; ComponentLink3Description: LCSC Part URL; ComponentLink3URL: https://lcsc.com/product-detail/Multilayer-Ceramic-Capacitors-MLCC---SMD-SMT_PSAProsperity-Dielectrics-PSAProsperity-Dielectrics-FN03B151K500PLG_C565502.html
footprint CAP-0201 (0201 (0603M) Capacitor)
pins: 1, 2

## FN03B152K100PLG
designator C?  Capacitance: 1.5nF  (hidden comment: *)
Capacitor, Ceramic (MLCC), 1.5nF, ±10%, 10V, X5R, ±10%, SMD 0201; Manufacturer: PSA(Prosperity Dielectrics); Manufacturer Part Number: FN03B152K100PLG; Package Size: 0201; JLCPCB Basic Part: No; JLCPCB Part Number: C565503; Supplier 1: LCSC; Category: Capacitors - MLCC; Supplier Part Number 1: C565503; Tolerance: ±10%; Voltage Rating: 10V; Temperature Coefficient: X5R; RoHS: Yes; ComponentLink1Description: Datasheet; ComponentLink2Description: JLCPCB Part URL; ComponentLink2URL: https://jlcpcb.com/partdetail/C565503; ComponentLink3Description: LCSC Part URL; ComponentLink3URL: https://lcsc.com/product-detail/Multilayer-Ceramic-Capacitors-MLCC---SMD-SMT_PSAProsperity-Dielectrics-PSAProsperity-Dielectrics-FN03B152K100PLG_C565503.html
footprint CAP-0201 (0201 (0603M) Capacitor)
pins: 1, 2

## FN03B152K160PLG
designator C?  Capacitance: 1.5nF  (hidden comment: *)
Capacitor, Ceramic (MLCC), 1.5nF, ±10%, 16V, X5R, ±10%, SMD 0201; Manufacturer: PSA(Prosperity Dielectrics); Manufacturer Part Number: FN03B152K160PLG; Package Size: 0201; JLCPCB Basic Part: No; JLCPCB Part Number: C565504; Supplier 1: LCSC; Category: Capacitors - MLCC; Supplier Part Number 1: C565504; Tolerance: ±10%; Voltage Rating: 16V; Temperature Coefficient: X5R; RoHS: Yes; ComponentLink1Description: Datasheet; ComponentLink2Description: JLCPCB Part URL; ComponentLink2URL: https://jlcpcb.com/partdetail/C565504; ComponentLink3Description: LCSC Part URL; ComponentLink3URL: https://lcsc.com/product-detail/Multilayer-Ceramic-Capacitors-MLCC---SMD-SMT_PSAProsperity-Dielectrics-PSAProsperity-Dielectrics-FN03B152K160PLG_C565504.html
footprint CAP-0201 (0201 (0603M) Capacitor)
pins: 1, 2

## FN03B152K250PLG
designator C?  Capacitance: 1.5nF  (hidden comment: *)
Capacitor, Ceramic (MLCC), 1.5nF, ±10%, 25V, X5R, ±10%, SMD 0201; Manufacturer: PSA(Prosperity Dielectrics); Manufacturer Part Number: FN03B152K250PLG; Package Size: 0201; JLCPCB Basic Part: No; JLCPCB Part Number: C565505; Supplier 1: LCSC; Category: Capacitors - MLCC; Supplier Part Number 1: C565505; Tolerance: ±10%; Voltage Rating: 25V; Temperature Coefficient: X5R; RoHS: Yes; ComponentLink1Description: Datasheet; ComponentLink2Description: JLCPCB Part URL; ComponentLink2URL: https://jlcpcb.com/partdetail/C565505; ComponentLink3Description: LCSC Part URL; ComponentLink3URL: https://lcsc.com/product-detail/Multilayer-Ceramic-Capacitors-MLCC---SMD-SMT_PSAProsperity-Dielectrics-PSAProsperity-Dielectrics-FN03B152K250PLG_C565505.html
footprint CAP-0201 (0201 (0603M) Capacitor)
pins: 1, 2

## FN03B153K6R3PLG
designator C?  Capacitance: 15nF  (hidden comment: *)
Capacitor, Ceramic (MLCC), 15nF, ±10%, 6.3V, X5R, ±10%, SMD 0201; Manufacturer: PSA(Prosperity Dielectrics); Manufacturer Part Number: FN03B153K6R3PLG; Package Size: 0201; JLCPCB Basic Part: No; JLCPCB Part Number: C565507; Supplier 1: LCSC; Category: Capacitors - MLCC; Supplier Part Number 1: C565507; Tolerance: ±10%; Voltage Rating: 6.3V; Temperature Coefficient: X5R; RoHS: Yes; ComponentLink1Description: Datasheet; ComponentLink2Description: JLCPCB Part URL; ComponentLink2URL: https://jlcpcb.com/partdetail/C565507; ComponentLink3Description: LCSC Part URL; ComponentLink3URL: https://lcsc.com/product-detail/Multilayer-Ceramic-Capacitors-MLCC---SMD-SMT_PSAProsperity-Dielectrics-PSAProsperity-Dielectrics-FN03B153K6R3PLG_C565507.html
footprint CAP-0201 (0201 (0603M) Capacitor)
pins: 1, 2

## FN03B153K100PLG
designator C?  Capacitance: 15nF  (hidden comment: *)
Capacitor, Ceramic (MLCC), 15nF, ±10%, 10V, X5R, ±10%, SMD 0201; Manufacturer: PSA(Prosperity Dielectrics); Manufacturer Part Number: FN03B153K100PLG; Package Size: 0201; JLCPCB Basic Part: No; JLCPCB Part Number: C565506; Supplier 1: LCSC; Category: Capacitors - MLCC; Supplier Part Number 1: C565506; Tolerance: ±10%; Voltage Rating: 10V; Temperature Coefficient: X5R; RoHS: Yes; ComponentLink1Description: Datasheet; ComponentLink2Description: JLCPCB Part URL; ComponentLink2URL: https://jlcpcb.com/partdetail/C565506; ComponentLink3Description: LCSC Part URL; ComponentLink3URL: https://lcsc.com/product-detail/Multilayer-Ceramic-Capacitors-MLCC---SMD-SMT_PSAProsperity-Dielectrics-PSAProsperity-Dielectrics-FN03B153K100PLG_C565506.html
footprint CAP-0201 (0201 (0603M) Capacitor)
pins: 1, 2

## FN03B221K160PLG
designator C?  Capacitance: 220pF  (hidden comment: *)
Capacitor, Ceramic (MLCC), 220pF, ±10%, 16V, X5R, ±10%, SMD 0201; Manufacturer: PSA(Prosperity Dielectrics); Manufacturer Part Number: FN03B221K160PLG; Package Size: 0201; JLCPCB Basic Part: No; JLCPCB Part Number: C565508; Supplier 1: LCSC; Category: Capacitors - MLCC; Supplier Part Number 1: C565508; Tolerance: ±10%; Voltage Rating: 16V; Temperature Coefficient: X5R; RoHS: Yes; ComponentLink1Description: Datasheet; ComponentLink2Description: JLCPCB Part URL; ComponentLink2URL: https://jlcpcb.com/partdetail/C565508; ComponentLink3Description: LCSC Part URL; ComponentLink3URL: https://lcsc.com/product-detail/Multilayer-Ceramic-Capacitors-MLCC---SMD-SMT_PSAProsperity-Dielectrics-PSAProsperity-Dielectrics-FN03B221K160PLG_C565508.html
footprint CAP-0201 (0201 (0603M) Capacitor)
pins: 1, 2

## FN03B221K250PLG
designator C?  Capacitance: 220pF  (hidden comment: *)
Capacitor, Ceramic (MLCC), 220pF, ±10%, 25V, X5R, ±10%, SMD 0201; Manufacturer: PSA(Prosperity Dielectrics); Manufacturer Part Number: FN03B221K250PLG; Package Size: 0201; JLCPCB Basic Part: No; JLCPCB Part Number: C565509; Supplier 1: LCSC; Category: Capacitors - MLCC; Supplier Part Number 1: C565509; Tolerance: ±10%; Voltage Rating: 25V; Temperature Coefficient: X5R; RoHS: Yes; ComponentLink1Description: Datasheet; ComponentLink2Description: JLCPCB Part URL; ComponentLink2URL: https://jlcpcb.com/partdetail/C565509; ComponentLink3Description: LCSC Part URL; ComponentLink3URL: https://lcsc.com/product-detail/Multilayer-Ceramic-Capacitors-MLCC---SMD-SMT_PSAProsperity-Dielectrics-PSAProsperity-Dielectrics-FN03B221K250PLG_C565509.html
footprint CAP-0201 (0201 (0603M) Capacitor)
pins: 1, 2
